# Altium footprint library Wedka_PcbLib.PcbLib: 18 footprints (part 1 of 2)
Each footprint in its own frame and in the unit in brackets; x right, y up, seen from the top. Pads: shape width x height; smd on the part's side, far side on the other; paste and mask are expansions set on the pad; w line width, h text height; cw(c..) or ccw(c..) is an arc to the next point about the centre after c.
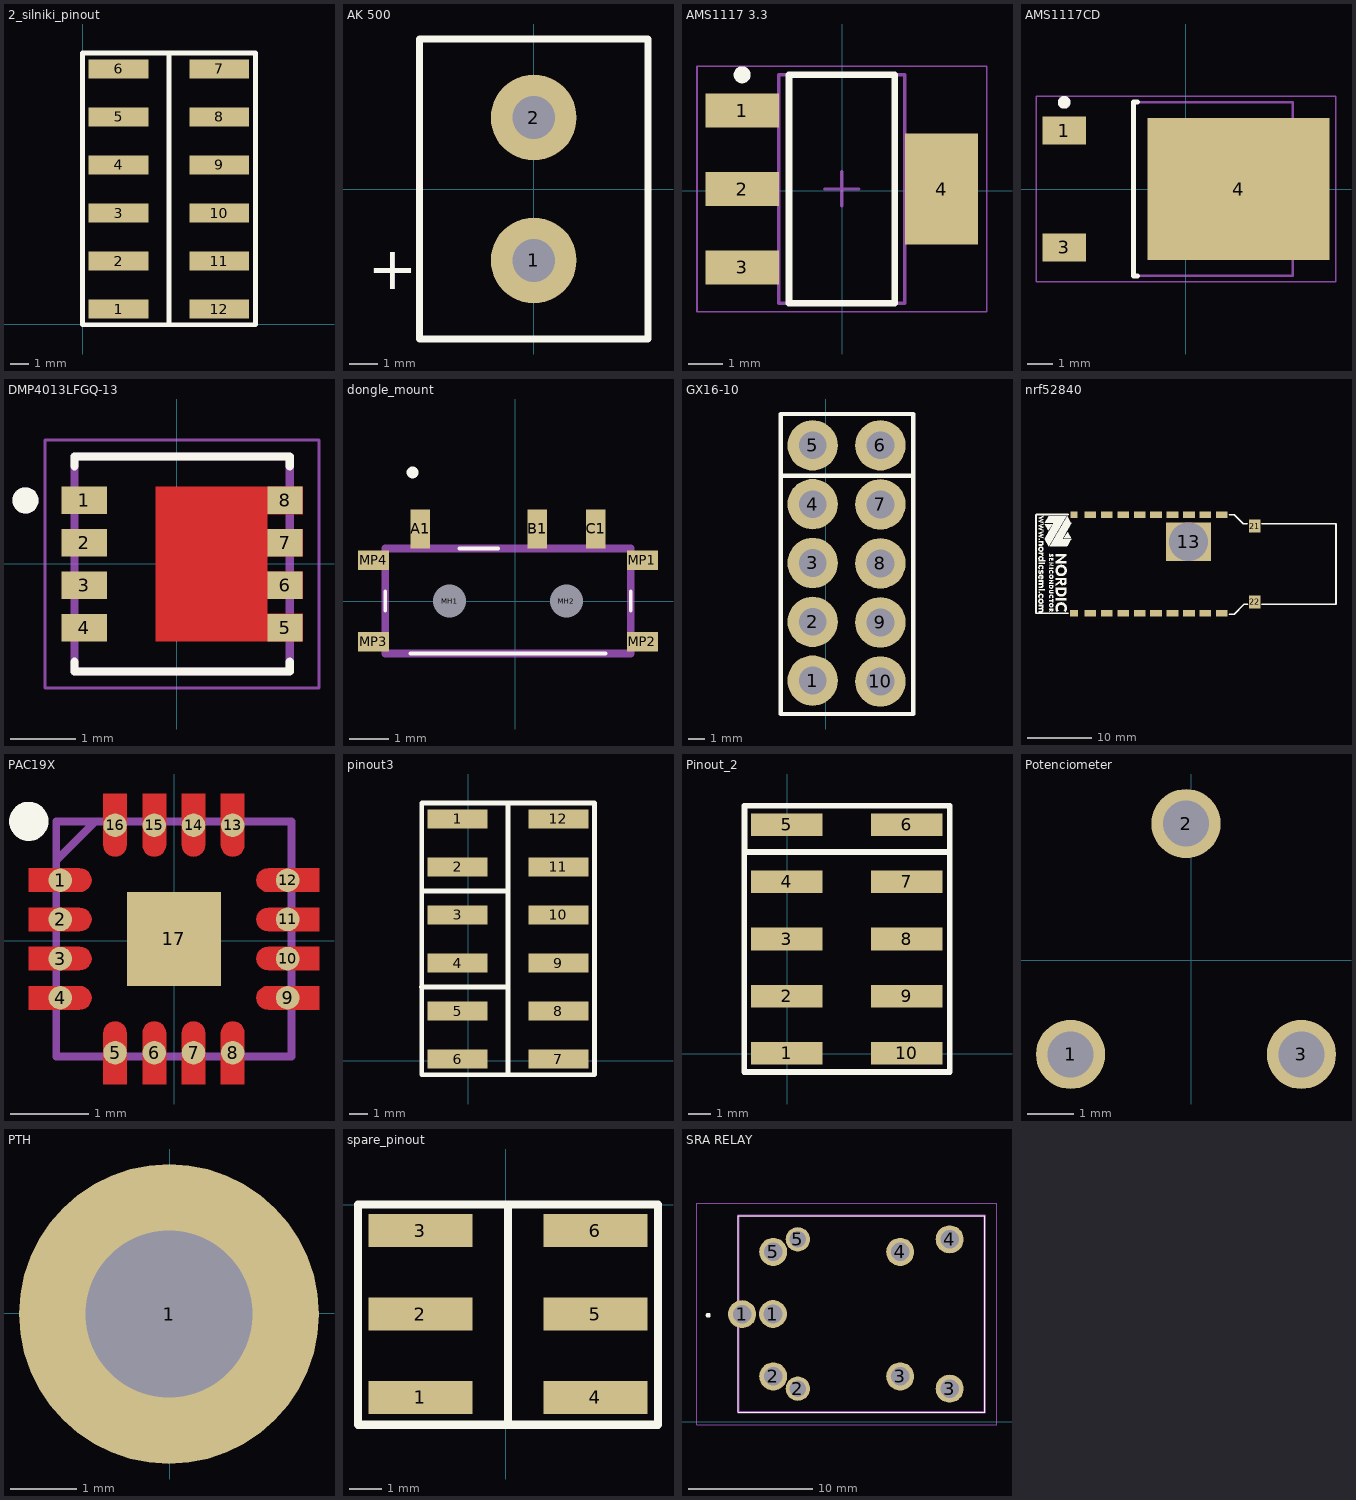
[diagram p0: the footprints below, top view; thin cyan lines are the x and y axes]

## 2_silniki_pinout [mm]
pads (12):
  rect 3.17x1 smd: 1(1.884,0.816) 2(1.884,3.356) 3(1.884,5.896) 4(1.884,8.436) 5(1.884,10.976) 6(1.884,13.516) 7(7.214,13.516) 8(7.214,10.976) 9(7.214,8.436) 10(7.214,5.896) 11(7.214,3.356) 12(7.214,0.816)
Top Overlay:
  lines w0.254: 4.554,-0.016 4.554,14.352 ; -0.016,-0.016 -0.016,14.352 9.125,14.352 9.125,-0.016 -0.016,-0.016
3D body "1241050-5--3DModel-STEP-1.STEP": height 10.23, standoff 0.01, extent 0.729,2.034 8.349,14.734
3D body "1241050-5--3DModel-STEP-1.STEP": height 10.23, standoff 0.01, extent 0.729,-0.506 8.349,12.194

## AK 500 [mm] "2pin raster 5mm"
pads (2):
  round 3 hole 1.5: 1(0,-2.5) 2(0,2.5)
Top Overlay:
  lines w0.254: -4,-5.25 4,-5.25 4,5.25 -4,5.25 -4,-5.25
  text "+" at -5.801,-3.501 h1.52
3D body "ak500 - 2.step": height 10, standoff -2.8, extent -3.481,-5.163 3.519,5.237

## AMS1117 3.3 [mm] "SOT-223"
pads (4):
  rect 2.15x1 smd: 1(-2.937,2.357) 2(-2.937,0.057) 3(-2.937,-2.243)
  rect 2.15x3.25 smd: 4(2.913,0.057)
Top Overlay:
  circle w0.25: c-2.937,3.407 r0.125
  lines w0.2: -1.562,-3.293 1.538,-3.293 1.538,3.407 -1.562,3.407 -1.562,-3.293
Top Assembly:
  lines w0.1: -1.862,-3.293 1.838,-3.293 1.838,3.407 -1.862,3.407 -1.862,-3.293
Mechanical 15:
  lines w0.05: -4.262,-3.543 4.238,-3.543 4.238,3.657 -4.262,3.657 -4.262,-3.543
  lines w0.1: -0.512,0.057 0.488,0.057 ; -0.012,-0.443 -0.012,0.557
3D body "SOT230P700X180-4N.step": height 1.8, standoff 0, extent -3.512,-3.293 3.488,3.407

## AMS1117CD [mm] "D-PAK, 3-Pads, Body 6,21x6,74mm (max), IPC Medium Density"
height 2.39
pads (3):
  rect 1.7x1.1 smd: 1(-4.75,2.28) 3(-4.75,-2.28)
  rect 7.1x5.55 smd: 4(2.05,0)
Top Overlay:
  circle w0.25: c-4.75,3.38 r0.125
  lines w0.2: -1.9,-3.4 -2.05,-3.4 -2.05,3.4 -1.9,3.4
Top Assembly:
  lines w0.1: -2.05,-3.375 -2.05,3.375 4.17,3.375 4.17,-3.375 -2.05,-3.375
Mechanical 15:
  lines w0.05: -5.85,-3.625 -5.85,3.625 5.85,3.625 5.85,-3.625 -5.85,-3.625
  lines w0.1: -0.5,0 0.5,0 ; 0,-0.5 0,0.5
3D body "DPAK228P1007X239-3N.step": height 2.85, standoff 0, extent -4.355,-3.375 5.72,3.375

## DMP4013LFGQ-13 [mm] "MOSFET P-Channel"
pads (8):
  rect 0.7x0.42 smd: 1(-1.418,0.97) 2(-1.418,0.32) 3(-1.418,-0.33) 4(-1.418,-0.98)
  rect 0.54x0.42 smd: 5(1.662,-0.98) 6(1.662,-0.33) 7(1.662,0.32) 8(1.662,0.97)
Top Layer:
  region: 1.932,0.76 1.392,0.76 1.392,0.53 1.932,0.53 1.932,0.11 1.392,0.11 1.392,-0.12 1.932,-0.12 1.932,-0.54 1.392,-0.54 1.392,-0.77 1.932,-0.77 1.932,-1.19 -0.318,-1.19 -0.318,1.18 1.932,1.18
Top Overlay:
  circle w0.2: c-2.318,0.97 r0.1
  lines w0.127: -1.568,-1.503 -1.568,-1.655 1.732,-1.655 1.732,-1.503 ; -1.568,1.494 -1.568,1.645 1.732,1.645 1.732,1.494
Top Paste:
  region: 1.082,-0.905 -0.018,-0.905 -0.018,0.895 1.082,0.895
Top Solder:
  region: 1.492,-1.29 -0.418,-1.29 -0.418,1.28 1.492,1.28
Mechanical 13:
  circle w0.2: c-2.318,0.97 r0.1
  lines w0.127: -1.568,-1.655 1.732,-1.655 1.732,1.645 -1.568,1.645 -1.568,-1.655
Mechanical 15:
  lines w0.05: -2.018,-1.905 -2.018,1.895 2.182,1.895 2.182,-1.905 -2.018,-1.905
3D body "step_temp.STEP": height 0.9, standoff 0, extent -1.568,-1.655 1.732,1.645

## dongle_mount [mm]
pads (9):
  rect 0.5x1 smd: A1(-2.441,1.86) B1(0.559,1.86) C1(2.059,1.86)
  round 0.425 hole 0.85 unplated: MH1(-1.691,0.01) MH2(1.309,0.01)
  rect 0.8x0.5 smd: MP1(3.259,1.06) MP2(3.259,-1.04) MP3(-3.641,-1.04) MP4(-3.641,1.06)
Top Overlay:
  lines w0.1: -3.341,-0.24 -3.341,0.26 -3.341,-0.24 ; -2.691,-1.34 2.309,-1.34 -2.691,-1.34 ; -1.441,1.36 -0.441,1.36 -1.441,1.36 ; 2.959,-0.24 2.959,0.26 2.959,-0.24
  lines w0.2: -2.691,3.31 ccw(c-2.641,3.31) -2.591,3.31 ; -2.691,3.31 cw(c-2.641,3.31) -2.591,3.31 ; -2.691,3.31 ccw(c-2.641,3.31) -2.591,3.31
Mechanical 15:
  lines w0.2: -3.341,-1.34 2.959,-1.34 2.959,1.36 -3.341,1.36 -3.341,-1.34
3D body "MSK12C02.stp": height 5.8, standoff -4.65, extent -10.231,-3.284 9.769,3.468

## GX16-10 [mm] "złącze szczelne"
pads (10):
  round 3 hole 1.65: 1(-0.774,64.093) 2(-0.774,67.593) 3(-0.774,71.093) 4(-0.774,74.593) 5(-0.774,78.093) 6(3.259,78.093) 7(3.259,74.58) 8(3.259,71.067) 9(3.259,67.554) 10(3.259,64.041)
Top Overlay:
  lines w0.254: -2.564,76.291 5.1,76.291 ; -2.672,62.105 5.209,62.105 5.209,79.96 -2.672,79.96 -2.672,62.105

## hole [mm]

## nrf52840 [mm]
pads (23):
  rect 1.1x1 smd: 1(28.321,42.799)
  rect 1.8x1 smd: 2(30.861,42.799) 3(33.401,42.799) 4(35.941,42.799) 5(38.481,42.799) 6(41.021,42.799) 7(43.561,42.799) 8(46.101,42.799) 9(48.641,42.799) 10(51.181,42.799) 12(30.861,27.559) 13(33.401,27.559) 14(35.941,27.559) 15(38.481,27.559) 16(41.021,27.559) 17(43.561,27.559) 18(46.101,27.559) 19(48.641,27.559) 20(51.181,27.559)
  rect 1.2x1 smd mask+0.102: 11(28.321,27.559)
  rect 7x6 hole 6 square unplated: 13(46.051,38.61)
  rect 1.8x2 smd: 21(56.261,41.021) 22(56.261,29.337)
Top Overlay:
  drawing of 56 lines, arcs and shapes, not listed
3D body "400250.step": height 4.6, standoff 0.03, extent 22.462,27.569 68.501,42.809

## PAC19X [mm]
pads (17):
  round 0.3 smd: 1(-1.452,0.775) 2(-1.452,0.275) 3(-1.452,-0.225) 4(-1.452,-0.725) 5(-0.752,-1.425) 6(-0.252,-1.425) 7(0.248,-1.425) 8(0.748,-1.425) 9(1.448,-0.725) 10(1.448,-0.225) 11(1.448,0.275) 12(1.448,0.775) 13(0.748,1.475) 14(0.248,1.475) 15(-0.252,1.475) 16(-0.752,1.475)
  rect 1.2x1.2 smd: 17(-0.002,0.025)
Top Layer:
  region: -0.602,1.875 -0.602,1.225 -0.607,1.187 -0.622,1.15 -0.646,1.119 -0.677,1.096 -0.713,1.081 -0.752,1.075 -0.791,1.081 -0.827,1.096 -0.858,1.119 -0.882,1.15 -0.897,1.187 -0.902,1.225 -0.902,1.875
  region: -0.102,1.875 -0.102,1.225 -0.107,1.187 -0.122,1.15 -0.146,1.119 -0.177,1.096 -0.213,1.081 -0.252,1.075 -0.291,1.081 -0.327,1.096 -0.358,1.119 -0.382,1.15 -0.397,1.187 -0.402,1.225 -0.402,1.875
  region: 0.398,1.875 0.398,1.225 0.393,1.187 0.378,1.15 0.354,1.119 0.323,1.096 0.287,1.081 0.248,1.075 0.209,1.081 0.173,1.096 0.142,1.119 0.118,1.15 0.103,1.187 0.098,1.225 0.098,1.875
  region: 0.898,1.875 0.898,1.225 0.893,1.187 0.878,1.15 0.854,1.119 0.823,1.096 0.787,1.081 0.748,1.075 0.709,1.081 0.673,1.096 0.642,1.119 0.618,1.15 0.603,1.187 0.598,1.225 0.598,1.875
  region: 1.848,0.625 1.198,0.625 1.159,0.631 1.123,0.646 1.092,0.669 1.068,0.7 1.053,0.737 1.048,0.775 1.053,0.814 1.068,0.85 1.092,0.882 1.123,0.905 1.159,0.92 1.198,0.925 1.848,0.925
  region: 1.848,0.125 1.198,0.125 1.159,0.131 1.123,0.146 1.092,0.169 1.068,0.2 1.053,0.237 1.048,0.275 1.053,0.314 1.068,0.35 1.092,0.382 1.123,0.405 1.159,0.42 1.198,0.425 1.848,0.425
  region: 1.848,-0.375 1.198,-0.375 1.159,-0.369 1.123,-0.354 1.092,-0.331 1.068,-0.3 1.053,-0.263 1.048,-0.225 1.053,-0.186 1.068,-0.15 1.092,-0.118 1.123,-0.095 1.159,-0.08 1.198,-0.075 1.848,-0.075
  region: 1.848,-0.875 1.198,-0.875 1.159,-0.869 1.123,-0.854 1.092,-0.831 1.068,-0.8 1.053,-0.763 1.048,-0.725 1.053,-0.686 1.068,-0.65 1.092,-0.618 1.123,-0.595 1.159,-0.58 1.198,-0.575 1.848,-0.575
  region: 0.598,-1.825 0.598,-1.175 0.603,-1.136 0.618,-1.1 0.642,-1.068 0.673,-1.045 0.709,-1.03 0.748,-1.025 0.787,-1.03 0.823,-1.045 0.854,-1.068 0.878,-1.1 0.893,-1.136 0.898,-1.175 0.898,-1.825
  region: 0.098,-1.825 0.098,-1.175 0.103,-1.136 0.118,-1.1 0.142,-1.068 0.173,-1.045 0.209,-1.03 0.248,-1.025 0.287,-1.03 0.323,-1.045 0.354,-1.068 0.378,-1.1 0.393,-1.136 0.398,-1.175 0.398,-1.825
  region: -0.402,-1.825 -0.402,-1.175 -0.397,-1.136 -0.382,-1.1 -0.358,-1.068 -0.327,-1.045 -0.291,-1.03 -0.252,-1.025 -0.213,-1.03 -0.177,-1.045 -0.146,-1.068 -0.122,-1.1 -0.107,-1.136 -0.102,-1.175 -0.102,-1.825
  region: -0.902,-1.825 -0.902,-1.175 -0.897,-1.136 -0.882,-1.1 -0.858,-1.068 -0.827,-1.045 -0.791,-1.03 -0.752,-1.025 -0.713,-1.03 -0.677,-1.045 -0.646,-1.068 -0.622,-1.1 -0.607,-1.136 -0.602,-1.175 -0.602,-1.825
  region: -1.852,-0.575 -1.202,-0.575 -1.163,-0.58 -1.127,-0.595 -1.096,-0.618 -1.072,-0.65 -1.057,-0.686 -1.052,-0.725 -1.057,-0.763 -1.072,-0.8 -1.096,-0.831 -1.127,-0.854 -1.163,-0.869 -1.202,-0.875 -1.852,-0.875
  region: -1.852,-0.075 -1.202,-0.075 -1.163,-0.08 -1.127,-0.095 -1.096,-0.118 -1.072,-0.15 -1.057,-0.186 -1.052,-0.225 -1.057,-0.263 -1.072,-0.3 -1.096,-0.331 -1.127,-0.354 -1.163,-0.369 -1.202,-0.375 -1.852,-0.375
  region: -1.852,0.425 -1.202,0.425 -1.163,0.42 -1.127,0.405 -1.096,0.382 -1.072,0.35 -1.057,0.314 -1.052,0.275 -1.057,0.237 -1.072,0.2 -1.096,0.169 -1.127,0.146 -1.163,0.131 -1.202,0.125 -1.852,0.125
  region: -1.852,0.925 -1.202,0.925 -1.163,0.92 -1.127,0.905 -1.096,0.882 -1.072,0.85 -1.057,0.814 -1.052,0.775 -1.057,0.737 -1.072,0.7 -1.096,0.669 -1.127,0.646 -1.163,0.631 -1.202,0.625 -1.852,0.625
Top Overlay:
  circle w0.25: c-1.852,1.525 r0.125
Mechanical 15:
  lines w0.1: -1.502,1.025 -1.002,1.525 ; -1.502,-1.475 -1.502,1.525 1.498,1.525 1.498,-1.475 -1.502,-1.475
3D body "PAC1951T-1E_4MX.stp": height 5.8, standoff -4.65, extent -9.969,-3.35 10.031,3.401

## pinout3 [mm]
pads (12):
  rect 3.17x1 smd: 1(-0.559,12.787) 2(-0.559,10.247) 3(-0.559,7.707) 4(-0.559,5.167) 5(-0.559,2.627) 6(-0.559,0.087) 7(4.771,0.087) 8(4.771,2.627) 9(4.771,5.167) 10(4.771,7.707) 11(4.771,10.247) 12(4.771,12.787)
Top Overlay:
  lines w0.254: -2.467,3.897 2.031,3.897 ; -2.46,13.624 6.681,13.624 ; -2.46,13.624 -2.46,-0.745 6.681,-0.745 6.681,13.624 ; -2.433,8.977 2.065,8.977 ; 2.111,-0.745 2.111,13.624
3D body "1241050-5--3DModel-STEP-1.STEP": height 10.23, standoff 0.01, extent -1.655,1.32 5.965,14.02
3D body "1241050-5--3DModel-STEP-1.STEP": height 10.23, standoff 0.01, extent -1.655,-1.22 5.965,11.48

## Pinout_2 [mm]
pads (10):
  rect 3.17x1 smd: 1(-0.015,0.028) 2(-0.015,2.568) 3(-0.015,5.108) 4(-0.015,7.648) 5(-0.015,10.188) 6(5.315,10.188) 7(5.315,7.648) 8(5.315,5.108) 9(5.315,2.568) 10(5.315,0.028)
Top Overlay:
  lines w0.254: 7.225,11.024 -1.903,11.024 -1.903,8.976 7.225,8.976 7.225,11.024 ; 7.225,11.024 -1.916,11.024 -1.916,-0.804 7.225,-0.804 7.225,11.024
3D body "1241050-5--3DModel-STEP-1.STEP": height 10.23, standoff 0.01, extent -1.17,-1.294 6.45,11.406

## Potenciometer [mm] "10k THT"
pads (3):
  round 1.5 hole 1: 1(-2.613,-2.035) 2(-0.113,2.965) 3(2.387,-2.035)
3D body "Poti_10kohm.stp": height 10.44, standoff -1.39, extent -3.5,-3.015 3.3,3.869

## PTH [mm] "Otwór montażowy"
pads (1):
  round 4.5 hole 2.5: 1(-0.012,-0.009)

## spare_pinout [mm]
pads (7):
  rect 3.17x1 smd: 1(-2.605,-5.876) 2(-2.605,-3.336) 3(-2.605,-0.796) 4(2.725,-5.876) 5(2.725,-3.336) 6(2.725,-0.796) ""(2.725,-0.796)
Top Overlay:
  lines w0.254: 0.065,-6.708 0.065,0 ; -4.505,-6.708 4.636,-6.708 4.636,0 -4.505,0 -4.505,-6.708

## SRA RELAY [mm]
pads (10):
  round 2.25 hole 1.5: 1(24.553,8.647) 1(27.029,8.659) 2(27.054,3.647) 3(37.253,3.647) 3(41.229,2.659) 4(37.253,13.647) 4(41.229,14.659) 5(27.053,13.647)
  round 1.95 hole 1.3: 2(29.029,2.659) 5(29.029,14.659)
Top Overlay:
  lines w0.1: 24.229,0.759 44.029,0.759 44.029,16.559 24.229,16.559 24.229,0.759
  lines w0.2: 21.829,8.459 ccw(c21.829,8.559) 21.829,8.659 ccw(c21.829,8.559) 21.829,8.459
Mechanical 13:
  lines w0.2: 24.229,0.759 44.029,0.759 44.029,16.559 24.229,16.559 24.229,0.759
Mechanical 15:
  lines w0.1: 20.929,-0.241 45.029,-0.241 45.029,17.559 20.929,17.559 20.929,-0.241
3D body "G5LA-14-DC24.stp": height 15.9, standoff -5, extent 24.229,0.759 44.029,16.559